# Altium integrated library Supernova Connectors.IntLib: 270 symbols (part 1 of 2)
Pins are listed as number, name and electrical type; pins without a type are passive.

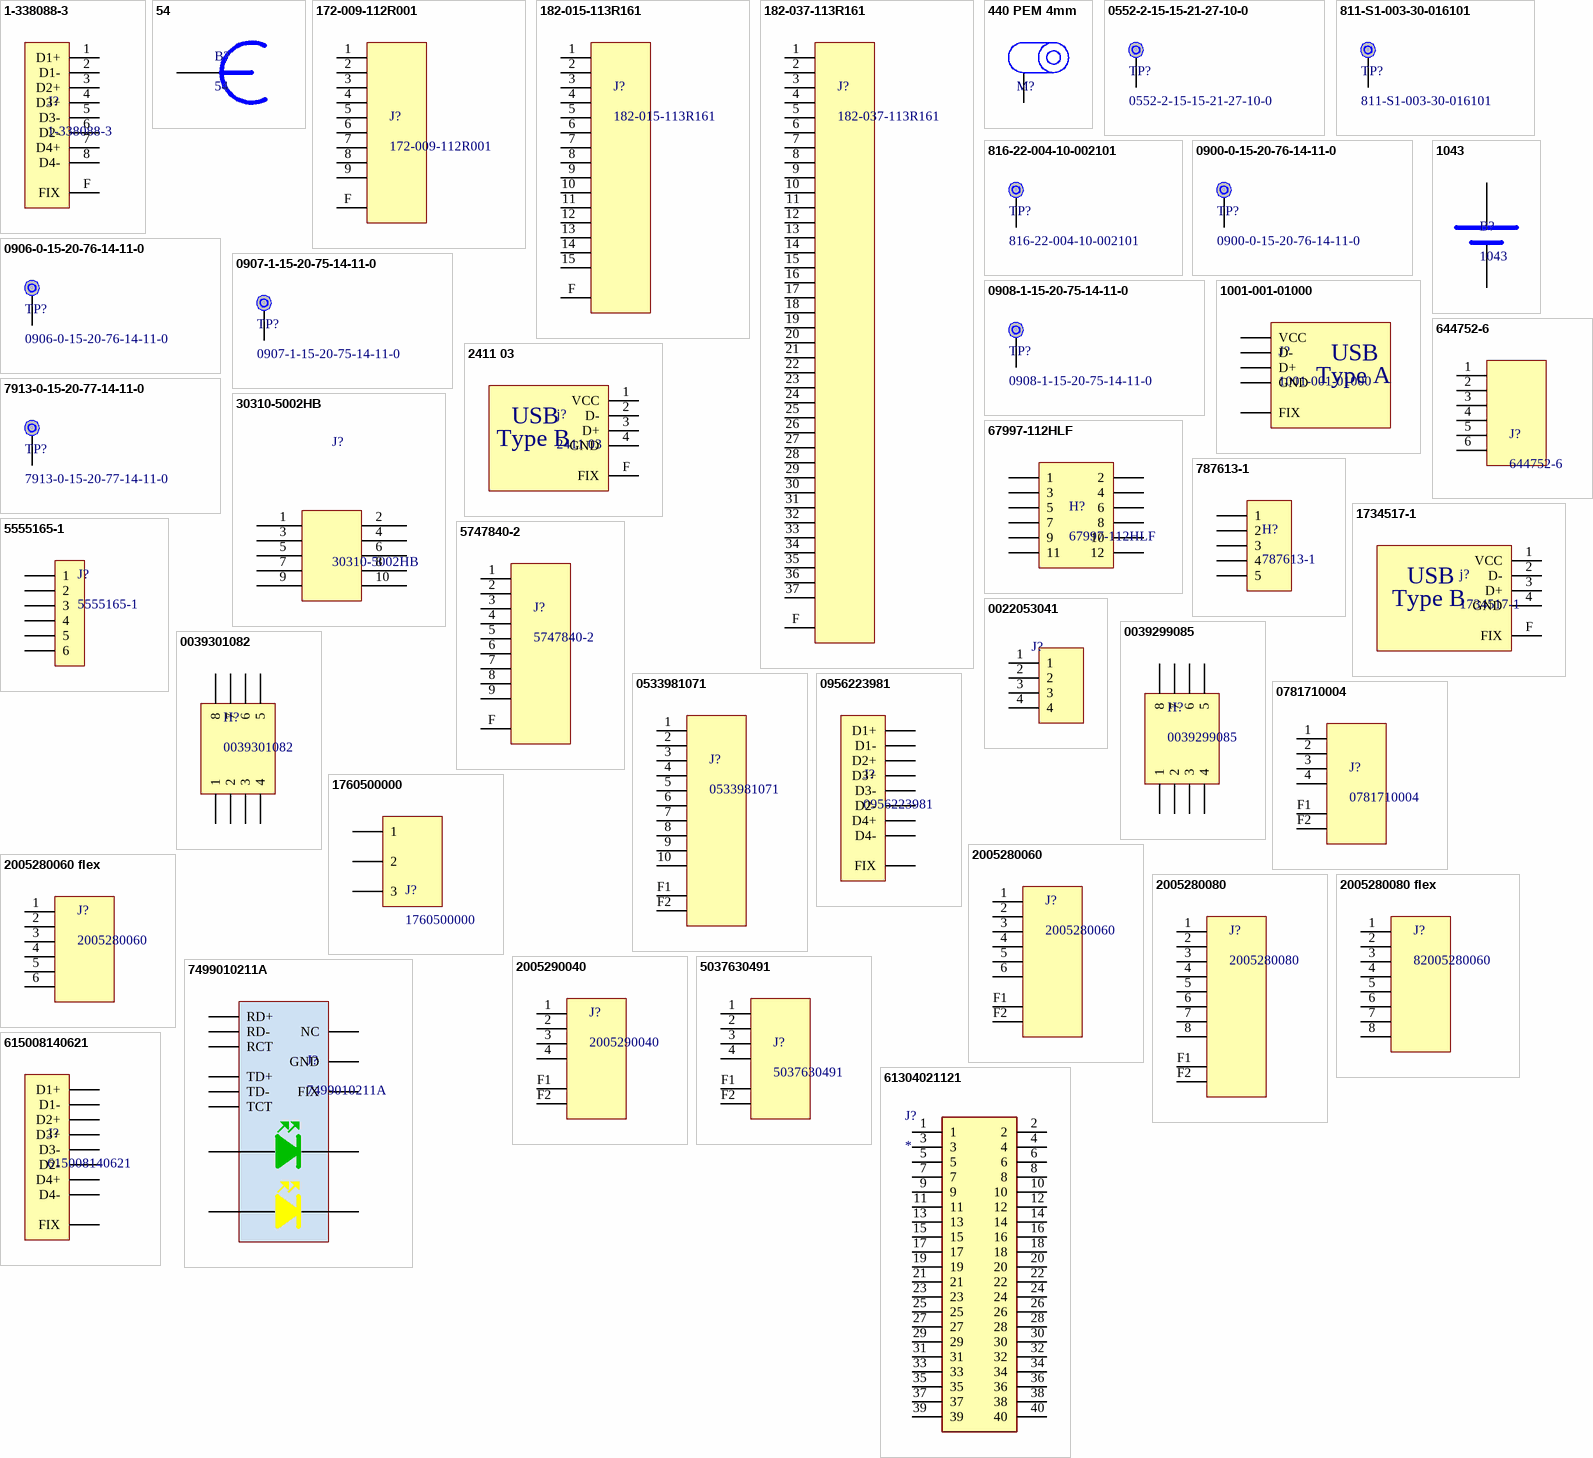
[diagram p0: symbols 1-338088-3 to 615008140621]

## 1-338088-3
designator J?
Header RJ45 No Magnetics Vertical SMD; Supplier 1: Digi-Key; Supplier Part Number 1: A99306CT-ND; Supplier 2: Digi-Key; Supplier Part Number 2: A98534CT-ND
footprint TE 1-338088-3
pins: 1 D1+, 2 D1-, 3 D2+, 4 D3+, 5 D3-, 6 D2-, 7 D4+, 8 D4-, F FIX

## 54
designator B?
Battery 18650 Clip; Supplier 1: Digi-Key; Supplier Part Number 1: 36-54-ND; Supplier 2: Mouser; Supplier Part Number 2: 534-54
footprint 18650 clip
pins: 1

## 172-009-112R001
designator J?
Header DB9 TH; System: Connector; Supplier 1: Digi-Key; Supplier Part Number 1: 1509MNA-ND; Supplier 2: Digi-Key; Supplier 3: Digi-Key; Supplier Part Number 2: AE10973-ND; Supplier Part Number 3: 1509MNEA-ND
footprint 172-009-112Ryy1
pins: 1, 2, 3 1, 4 1, 5 1, 6, 7, 8, 9, F

## 182-015-113R161
designator J?
Header DB15 TH RA; System: Connector; Supplier 1: Digi-Key; Supplier 2: Mouser; Supplier Part Number 1: 182-715ME-ND; Supplier Part Number 2: 636-182-015-113R161
footprint D-Sub-15
pins: 1, 2, 3, 4, 5, 6, 7, 8, 9, 10, 11, 12, 13, 14, 15, F

## 182-037-113R161
designator J?
Header DB37 TH RA; System: Connector; Supplier 1: Digi-Key; Supplier 2: Mouser; Supplier Part Number 1: 182-737ME-ND; Supplier Part Number 2: 636-182-037-113R161
footprint D-Sub-37
pins: 1, 2, 3, 4, 5, 6, 7, 8, 9, 10, 11, 12, 13, 14, 15, 16, 17, 18, 19, 20, 21, 22, 23, 24, 25, 26 13, 27, 28, 29, 30, 31, 32, 33, 34, 35, 36, 37, F

## 440 PEM 4mm
designator M?, comment #4-40 4mm  (value not drawn)
PEM, 440 4mm; System: Connector
footprint 440 PEM
pins: 1

## 0552-2-15-15-21-27-10-0
designator TP?
Testpoint Pin socket; System: Connector; Supplier 1: Digi-Key; Supplier Part Number 1: ED11345-ND; Supplier 2: Mouser; Supplier Part Number 2: 575-552215
footprint 0552-2-15-15-21-27-10-0 (Pin socket)
pins: 1

## 811-S1-003-30-016101
designator TP?
Testpoint Spring SMD x3; System: Connector; Supplier 1: Digi-Key; Supplier 2: Mouser; Supplier Part Number 1: 1212-1522-ND; Supplier Part Number 2: 437-811S100330016101
footprint Spring Testpoint x3 SMD
pins: 1

## 816-22-004-10-002101
designator TP?
Testpoint Spring x3; System: Connector; Supplier 1: Digi-Key; Supplier Part Number 1: ED10676-ND; Supplier 2: Digi-Key; Supplier Part Number 2: 811-S1-003-10-017101-ND
footprint Spring Testpoint x3
pins: 1

## 0900-0-15-20-76-14-11-0
designator TP?
Testpoint Spring SMD short; System: Connector; Supplier 1: Mouser; Supplier 2: Digi-Key; Supplier Part Number 1: 575-0900015207614110; Supplier Part Number 2: ED9000-ND
footprint Spring Testpoint SMD
pins: 1

## 0906-0-15-20-76-14-11-0
designator TP?
Testpoint Spring short; System: Connector; Supplier 1: Mouser; Supplier 2: Digi-Key; Supplier Part Number 1: 575-906015; Supplier Part Number 2: ED8180-ND
footprint Spring Testpoint - short
pins: 1

## 0907-1-15-20-75-14-11-0
designator TP?
Testpoint Spring SMD; System: Connector; Supplier 1: Mouser; Supplier 2: Digi-Key; Supplier Part Number 1: 575-907111; Supplier Part Number 2: ED5064-ND
footprint Spring Testpoint SMD
pins: 1

## 0908-1-15-20-75-14-11-0
designator TP?
Testpoint Spring; System: Connector; Supplier 1: Digi-Key; Supplier 2: Mouser; Supplier Part Number 1: ED90385-ND; Supplier Part Number 2: 575-0908115
footprint Spring Testpoint
pins: 1

## 1001-001-01000
designator J?
Header USB Type A; Supplier 1: Digi-Key; Supplier Part Number 1: 1175-1263-ND; Supplier 2: Digi-Key; Supplier Part Number 2: A31726-ND
footprint USB type A
pins: 1 VCC, 2 D-, 3 D+, 4 GND, F FIX
text: USB; Type A

## 1043
designator B?
Battery 18650 Holder; Supplier 1: Digi-Key; Supplier Part Number 1: 36-1043-ND; Supplier 2: Mouser; Supplier Part Number 2: 534-1043
footprint 1043
footprint 1043 - non-polar
pins: 1, 2

## 2411 03
designator j?
Header USB B TH RA; Supplier 1: Newark; Supplier Part Number 1: 31M6500; Supplier 2: Digi-Key; Supplier Part Number 2: 609-1039-ND
footprint USB-B-RA
pins: 1 VCC, 2 D-, 3 D+, 4 GND, F FIX
text: USB; Type B

## 7913-0-15-20-77-14-11-0
designator TP?
Testpoint Spring TH; System: Connector; Supplier 1: Digi-Key; Supplier Part Number 1: ED10398-ND; Supplier 2: Mouser; Supplier Part Number 2: 575-7913015207714110
footprint 7913-0-15-20-77-14-11-0 (Pin socket)
pins: 1

## 30310-5002HB
designator J?
Header 10 pin Box RA; System: Connector; Supplier 1: Digi-Key; Supplier 2: Digi-Key; Supplier Part Number 1: 3M15452-ND; Supplier Part Number 2: A33179-ND
footprint 2x5 Shrouded Box RA (2x5 Shrouded Box)
pins: 1, 2, 3, 4, 5, 6, 7, 8, 9, 10

## 67997-112HLF
designator H?
Header 6x2 TH; System: Connector; Supplier 1: Digi-Key; Supplier Part Number 1: 609-3227-ND; Supplier 2: Digi-Key; Supplier Part Number 2: SAM10851-ND
footprint 6x2 0.100" header
pins: 1, 2, 3, 4, 5, 6, 7, 8, 9, 10, 11, 12

## 644752-6
designator J?
Header MTA 6 pin; System: Connector; Supplier 1: Digi-Key; Supplier Part Number 1: A24168-ND; Supplier 2: Mouser; Supplier Part Number 2: 571-6447526
footprint 644752-6
pins: 1, 2, 3 1, 4 1, 5 1, 6

## 787613-1
designator H?
Header 5 Pin Blade Female; Supplier 1: Digi-Key; Supplier 2: Mouser; Supplier Part Number 1: 787613-1-ND; Supplier Part Number 2: 571-787613-1
footprint 787613-1
pins: 1, 2, 3, 4, 5

## 1734517-1
designator j?
Header USB B SMD; Supplier 1: Digi-Key; Supplier Part Number 1: A111053CT-ND; Supplier 2: Mouser; Supplier Part Number 2: 571-1734517-1
footprint TE 1734517-1
pins: 1 VCC, 2 D-, 3 D+, 4 GND, F FIX
text: USB; Type B

## 5555165-1
designator J?
Header RJ11 Right angle; Supplier 1: Digi-Key; Supplier Part Number 1: A31422-ND; Supplier 2: Digi-Key; Supplier Part Number 2: AE10383-ND
footprint 5555165-1
pins: 1, 2, 3, 4, 5, 6

## 5747840-2
designator J?
Header DB9 TH RA; Supplier 1: Digi-Key; Supplier Part Number 1: A32090-ND; Supplier 2: Mouser; Supplier Part Number 2: 571-5747840-2; System: *
footprint 5747840-2
pins: 1, 2, 3 1, 4 1, 5 1, 6, 7, 8, 9, F

## 0022053041
designator J?  (value not drawn)
Header 4POS .100 R/A TIN; System: Connector; Supplier 1: Digi-Key; Supplier 2: Digi-Key; Supplier Part Number 1: WM4302-ND; Supplier Part Number 2: WM10159-ND
footprint 4POS SMBUS Molex Inc. (CONN HEADER 4POS .100 R/A TIN 0022053041)
pins: 1, 2, 3, 4

## 0039299085
designator H?
Header 4x2 TH 4.2mm pitch; System: Connector; Supplier 1: Digi-Key; Supplier 2: Digi-Key; Supplier Part Number 1: WM2844-ND; Supplier Part Number 2: 23-0039299084-ND
footprint 0039299085
pins: 1, 2, 3, 4, 5, 6, 7, 8

## 0039301082
designator H?
Header 4x2 TH RA 4.2mm pitch; System: Connector; Supplier 1: Digi-Key; Supplier 2: Digi-Key; Supplier Part Number 1: WM21366-ND; Supplier Part Number 2: WM1366-ND
footprint 0039301082
pins: 1, 2, 3, 4, 5, 6, 7, 8

## 0533981071
designator J?
Header PicoBlade 10-Pin; System: Connector; Supplier 1: Digi-Key; Supplier 2: Mouser; Supplier Part Number 1: WM7614CT-ND; Supplier Part Number 2: 538-53398-1071
footprint 0533981071
pins: 1, 2, 3, 4, 5, 6, 7, 8, 9, 10, F1, F2

## 0781710004
designator J?
Header Pico-EZMate 4 pin; System: Connector; Supplier 1: Digi-Key; Supplier 2: Mouser; Supplier Part Number 2: 538-78171-0004; Supplier Part Number 1: WM4460CT-ND
footprint 0781710004
pins: 1, 2, 3 1, 4 1, F1 1, F2 1

## 0956223981
designator J?
Header RJ45 No Magnetics RA TH Tab=Down; Supplier 1: Digi-Key; Supplier Part Number 1: WM3653-ND; Supplier 2: Digi-Key; Supplier Part Number 2: AE10387-ND
footprint 956223981
pins: 1 D1+, 2 D1-, 3 D2+, 4 D3+, 5 D3-, 6 D2-, 7 D4+, 8 D4-, F FIX

## 1760500000
designator J?
Header Screw terminal 3 pins; Supplier 1: Digi-Key; Supplier 2: Digi-Key; Supplier Part Number 1: 281-2882-ND; Supplier Part Number 2: ED1976-ND
footprint ED500/3DS
pins: 1, 2, 3

## 2005280060
designator J?
Header Flex Connector 6 pin; top side; notched; System: Connector; Supplier 1: Digi-Key; Supplier Part Number 1: WM24188CT-ND; Supplier 2: Mouser; Supplier Part Number 2: 538-200528-0060
footprint 2005280060
pins: 1, 2 1, 3 1, 4 1, 5 2, 6 3, F1, F2

## 2005280060 flex
designator J?, comment 2005280060  (no BOM)
Flex Connector 4 pin; top side; notched; System: Connector
footprint 2005280060 mating flex
pins: 1, 2 1, 3 1, 4 1, 5 2, 6 3

## 2005280080
designator J?
Header Flex Connector 8 pin; top side; notched; System: Connector; Supplier 1: Mouser; Supplier Part Number 1: 538-200528-0080; Supplier 2: Digi-Key; Supplier Part Number 2: WM17815CT-ND
footprint 2005280080
pins: 1, 2 1, 3 1, 4 1, 5 2, 6 3, 7 2, 8 3, F1, F2

## 2005280080 flex
designator J?, comment 82005280060  (no BOM)
Flex Connector 8 pin; notched; System: Connector
footprint 2005280080 mating flex - SM Defined
footprint 2005280080 mating flex
pins: 1, 2 1, 3 1, 4 1, 5 2, 6 3, 7 2, 8 3

## 2005290040
designator J?
Header Flex Connector 4 pin; top side; notched; Supplier 1: Digi-Key; Supplier 2: Mouser; Supplier Part Number 1: WM24189CT-ND; Supplier Part Number 2: 538-200529-0040; System: Connector
footprint 2005290040
pins: 1, 2 1, 3 1, 4 1, F1, F2

## 5037630491
designator J?
Header Pico-Lock 4 pin; System: Connector; Supplier 1: Digi-Key; Supplier 2: Mouser; Supplier Part Number 1: WM10655CT-ND; Supplier Part Number 2: 538-503763-0491
footprint 5037630491
pins: 1, 2, 3 1, 4 1, F1, F2

## 7499010211A
designator J?
Header RJ45 with Magnetics RA TH Tab=Down; Supplier 1: Digi-Key; Supplier 2: Digi-Key; Supplier Part Number 1: 732-4506-5-ND; Supplier Part Number 2: 553-1619-5-ND
footprint 7499010211A
pins: 1 TD+, 2 TD-, 3 RD+, 4 TCT, 5 RCT, 6 RD-, 7 NC, 8 GND, 9, 10, 11, 12, F FIX

## 61304021121
designator J?
Connector; Manufacturer_Name: Wurth Elektronik; Manufacturer_Part_Number: 61304021121; Datasheet Link: https://katalog.we-online.com/em/datasheet/6130xx21121.pdf; Height: 8.69mm; Mouser Part Number: 710-61304021121; Mouser Price/Stock: https://www.mouser.co.uk/ProductDetail/Wurth-Elektronik/61304021121?qs=PhR8RmCirEYWKI5WqdDUyg%3D%3D
footprint HDRV40W64P254X254_2X20_5080X508X869P
pins: 1, 2, 3, 4, 5, 6, 7, 8, 9, 10, 11, 12, 13, 14, 15, 16, 17, 18, 19, 20, 21, 22, 23, 24, 25, 26, 27, 28, 29, 30, 31, 32, 33, 34, 35, 36, 37, 38, 39, 40

## 615008140621
designator J?
Header RJ45 No Magnetics RA TH Tab=Up; Supplier 1: Digi-Key; Supplier Part Number 1: 732-2742-ND; Supplier 2: Digi-Key; Supplier Part Number 2: RJHSE-5480-ND
footprint RJ45 No Mag
pins: 1 D1+, 2 D1-, 3 D2+, 4 D3+, 5 D3-, 6 D2-, 7 D4+, 8 D4-, F FIX

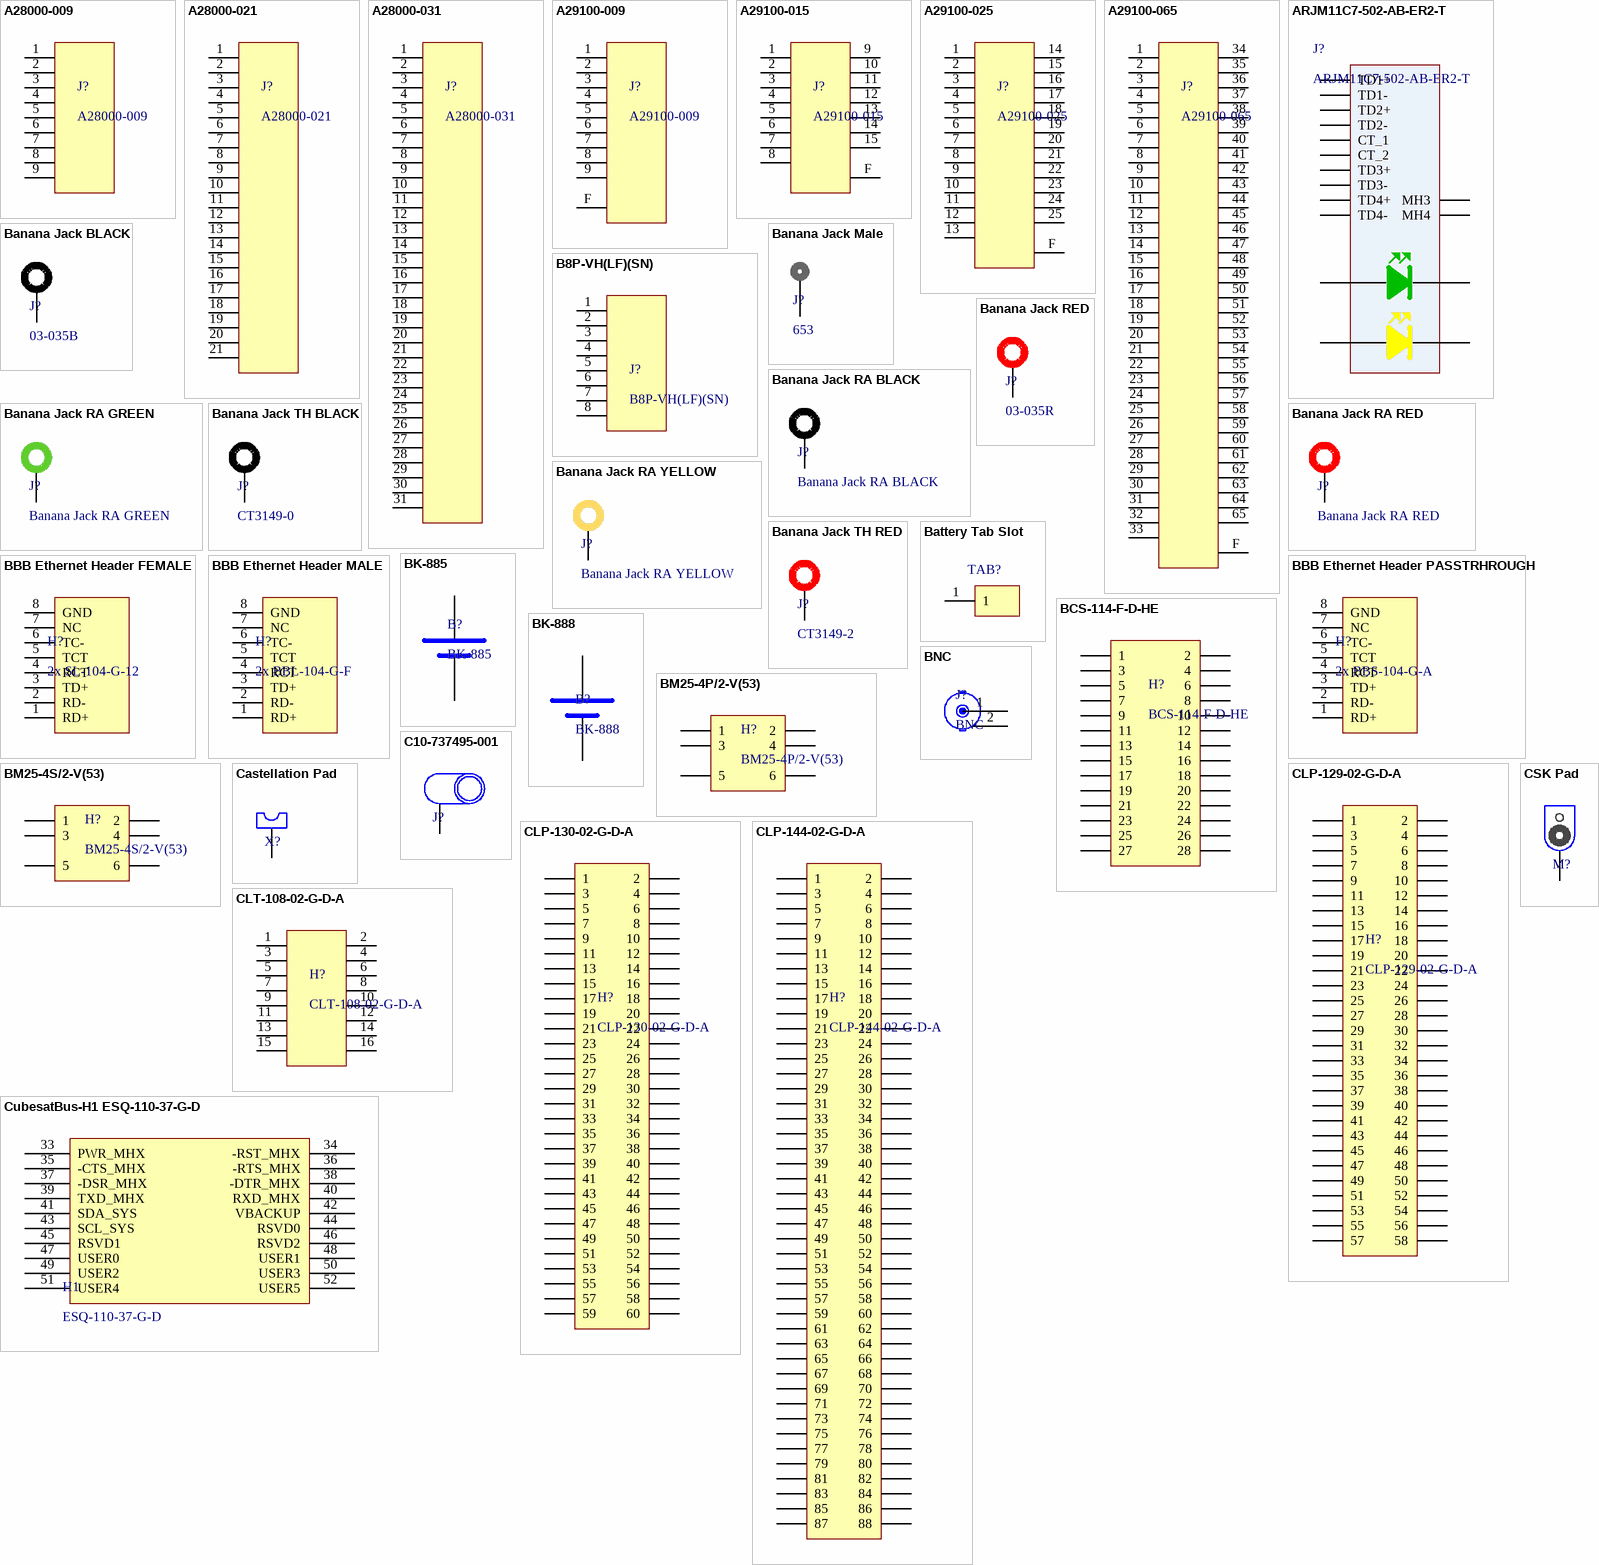
[diagram p1: symbols A28000-009 to CubesatBus-H1 ESQ-110-37-G-D]

## A28000-009
designator J?
Connector Omnetics Bi-Lobe 9 pins
pins: 1, 2, 3 1, 4 1, 5 1, 6 1, 7 1, 8 1, 9 1

## A28000-021
designator J?
Connector Omnetics Bi-Lobe 21 pins
pins: 1, 2, 3 1, 4 1, 5 1, 6 1, 7 1, 8 1, 9 1, 10 1, 11 1, 12 1, 13 1, 14 1, 15 2, 16 3, 17 4, 18 5, 19 6, 20 7, 21 8

## A28000-031
designator J?
Connector Omnetics Bi-Lobe 31 pins
pins: 1, 2, 3 1, 4 1, 5 1, 6 1, 7 1, 8 1, 9 1, 10 1, 11 1, 12 1, 13 1, 14 1, 15 2, 16 3, 17 4, 18 5, 19 6, 20 7, 21 8, 22 9, 23 10, 24 11, 25 12, 26 13, 27 14, 28 15, 29 16, 30 17, 31 18

## A29100-009
designator J?
Header Omnetics A29100-009; System: Connector; Manufacturer 1: Omnetics; Manufacturer Part Number 1: A29100-009; Supplier 1: Omnetics; Supplier Part Number 1: A29100-009; Supplier Pricing 1: 110.00
footprint A29100-009
pins: 1, 2, 3 1, 4 1, 5 1, 6, 7, 8, 9, F

## A29100-015
designator J?
Header Omnetics A29100-015; System: Connector; Manufacturer 1: Omnetics; Manufacturer Part Number 1: A29100-015; Supplier 1: Omnetics; Supplier Part Number 1: A29100-015; Supplier Pricing 1: 110.00
footprint A29100-015
pins: 1, 2, 3 1, 4 1, 5 1, 6, 7, 8, 9, 10, 11, 12, 13, 14, 15, F

## A29100-025
designator J?
Header Omnetics A29100-025; System: Connector; Manufacturer 1: Omnetics; Manufacturer Part Number 1: A29100-025; Supplier 1: Omnetics; Supplier Part Number 1: A29100-025; Supplier Pricing 1: 110.00
footprint A29100-025
pins: 1, 2, 3 1, 4 1, 5 1, 6, 7, 8, 9, 10, 11, 12, 13, 14, 15, 16, 17, 18, 19, 20, 21, 22, 23, 24, 25, F

## A29100-065
designator J?
Header Omnetics A29100-065; System: Connector; Manufacturer 1: Omnetics; Manufacturer Part Number 1: A29100-065; Supplier 1: Omnetics; Supplier Part Number 1: A29100-065; Supplier Pricing 1: 110.00
footprint A29100-065
pins: 1, 2, 3 1, 4 1, 5 1, 6, 7, 8, 9, 10, 11, 12, 13, 14, 15, 16, 17, 18, 19, 20, 21, 22, 23, 24, 25, 26, 27, 28, 29, 30, 31, 32, 33, 34, 35, 36, 37, 38, 39, 40, 41, 42, 43, 44, 45, 46, 47, 48, 49, 50, 51, 52, 53, 54, 55, 56, 57, 58, 59, 60, 61, 62, 63, 64, 65, F

## ARJM11C7-502-AB-ER2-T
designator J?
RJ45 JACK W/MAG 1X1 1000BASE-T; Manufacturer_Name: ABRACON; Datasheet Link: https://abracon.com/Magnetics/ARJM11.pdf; Height: 13.7mm; Manufacturer_Part_Number: ARJM11C7-502-AB-ER2-T; Mouser Part Number: 815-RJM11C7502ABER2T; Mouser Price/Stock: https://www.mouser.co.uk/ProductDetail/ABRACON/ARJM11C7-502-AB-ER2-T?qs=YCa%2FAAYMW01Li4L1TO4qtw%3D%3D; Arrow Part Number: ARJM11C7-502-AB-ER2-T; Arrow Price/Stock: https://www.arrow.com/en/products/arjm11c7-502-ab-er2-t/abracon?region=nac; Supplier 1: Digi-Key; Supplier 2: Mouser; Supplier Part Number 1: 535-14130-6-ND; Supplier Part Number 2: 815-RJM11C7502ABER2T
footprint ARJM11C7502ABER2T
pins: MH3, MH4, P1 TD1+, P2 TD1-, P3 TD2+, P4 TD2-, P5 CT_1, P6 CT_2, P7 TD3+, P8 TD3-, P9 TD4+, P10 TD4-, P11, P12, P13, P14

## B8P-VH(LF)(SN)
designator J?
Header VH 8 pin; System: Connector; Supplier 1: Digi-Key; Supplier Part Number 1: 455-1645-ND
footprint B8P-VH(LF)(SN)
pins: 1, 2, 3 1, 4 1, 5 1, 6, 7, 8

## Banana Jack BLACK
designator J?, comment 03-035B
Banana Jack Vertical BLACK; Manufacturer 1: Jameco Benchpro; Supplier 1: Jameco; Supplier Part Number 1: 2244439; Manufacturer Part Number 1: 03-035B; Supplier Pricing 1: 1.19
footprint Banana Jack BLACK
pins: 1

## Banana Jack Male
designator J?, comment 653
Banana Jack MALE; Supplier 1: Digi-Key; Supplier 2: Mouser; Supplier Part Number 1: 36-653-ND; Supplier Part Number 2: 534-653
footprint Banana Jack MALE
pins: 1

## Banana Jack RA BLACK
designator J?
Supplier 1: Digi-Key; Supplier Part Number 1: BKCT3151SP-0-ND; Supplier 2: Mouser; Supplier Part Number 2: 510-CT3151SP-0
footprint BANANA RA BLACK
pins: 1

## Banana Jack RA GREEN
designator J?
Supplier 1: Digi-Key; Supplier Part Number 1: BKCT3151SP-5-ND
footprint BANANA RA GREEN
pins: 1

## Banana Jack RA RED
designator J?
Supplier 1: Digi-Key; Supplier Part Number 1: BKCT3151SP-2-ND; Supplier 2: Mouser; Supplier Part Number 2: 510-CT3151SP-2
footprint BANANA RA RED
pins: 1

## Banana Jack RA YELLOW
designator J?
Supplier 1: Digi-Key; Supplier Part Number 1: BKCT3151SP-4-ND
footprint BANANA RA YELLOW
pins: 1

## Banana Jack RED
designator J?, comment 03-035R
Banana Jack Vertical RED; Manufacturer 1: Jameco Benchpro; Supplier 1: Jameco; Supplier Part Number 1: 2244447; Manufacturer Part Number 1: 03-035R; Supplier Pricing 1: 1.19
footprint Banana Jack RED
pins: 1

## Banana Jack TH BLACK
designator J?, comment CT3149-0
Banana Jack Vertical TH BLACK; Supplier 1: Digi-Key; Supplier Part Number 1: BKCT3149-0-ND; Supplier 2: Mouser; Supplier Part Number 2: 510-CT3149-0
footprint Banana Jack TH BLACK
pins: 1

## Banana Jack TH RED
designator J?, comment CT3149-2
Banana Jack Vertical TH RED; Supplier 1: Digi-Key; Supplier Part Number 1: BKCT3149-2-ND; Supplier 2: Mouser; Supplier Part Number 2: 510-CT3149-2
footprint Banana Jack TH RED
pins: 1

## Battery Tab Slot
designator TAB?, comment Battery Tab Pad  (value not drawn)  (no BOM)
Battery tab slot
footprint Battery Tab Pad (Slot - 1mm x 6mm)
footprint Battery Tab Slot (Slot - 1.5mm x 7.25mm)
footprint Battery Tab Pad with slot (Slot - 1mm x 6mm)
pins: 1

## BBB Ethernet Header FEMALE
designator H?, comment 2x SL-104-G-12
Header for BBB Ethernet; System: Connector; Quantity: 2; Supplier 1: Digi-Key; Supplier 2: Newark; Supplier Part Number 1: SAM1104-08-ND; Supplier Part Number 2: 11P6617
footprint Ethernet Header FEMALE
pins: 1 RD+, 2 RD-, 3 TD+, 4 RCT, 5 TCT, 6 TC-, 7 NC, 8 GND

## BBB Ethernet Header MALE
designator H?, comment 2x BBL-104-G-F
Header for BBB Ethernet; System: Connector; Supplier 1: Newark; Supplier 2: Digi-Key; Supplier Part Number 1: 11P3037; Supplier Part Number 2: SAM1001-08-ND
footprint Ethernet Header MALE
pins: 1 RD+, 2 RD-, 3 TD+, 4 RCT, 5 TCT, 6 TC-, 7 NC, 8 GND

## BBB Ethernet Header PASSTRHROUGH
designator H?, comment 2x BBS-104-G-A
Header for BBB Ethernet; System: Connector; Supplier 1: Digi-Key; Supplier 2: Newark; Supplier Part Number 1: SAM1004-08-ND; Supplier Part Number 2: 11P3149
footprint Ethernet Header PASSTHROUGH
pins: 1 RD+, 2 RD-, 3 TD+, 4 RCT, 5 TCT, 6 TC-, 7 NC, 8 GND

## BCS-114-F-D-HE
designator H?
Header 14x2 TH RA; System: Connector; Supplier 1: Digi-Key; Supplier Part Number 1: BCS-114-F-D-HE-ND; Supplier 2: Digi-Key; Supplier 3: Newark; Supplier 4: Digi-Key; Supplier Part Number 2: BCS-114-LM-D-HE-ND; Supplier Part Number 3: 87P2270; Supplier Part Number 4: BCS-114-S-D-HE-ND
footprint BCS-114-F-D-HE
pins: 1, 2, 3, 4, 5, 6, 7, 8, 9, 10, 11, 12, 13, 14, 15, 16, 17, 18, 19, 20, 21, 22, 23, 24, 25, 26, 27, 28

## BK-885
designator B?
Battery 1216 Holder; Supplier 1: Digi-Key; Supplier Part Number 1: BK-885-ND; Supplier 2: Digi-Key; Supplier 3: Digi-Key; Supplier Part Number 2: BK-885-CT-ND; Supplier Part Number 3: 36-3000CT-ND
footprint 1216 Battery Holder
pins: 1, 2

## BK-888
designator B?
Battery 20xx Holder; Supplier 1: Digi-Key; Supplier 2: Digi-Key; Supplier Part Number 1: BK-888-ND; Supplier Part Number 2: 36-3003-ND
footprint BK-888
pins: 1, 2

## BM25-4P/2-V(53)
designator H?
Header 6 pin micro; 2 power; 4 signal; System: Connector; Supplier 1: Digi-Key; Supplier 2: Mouser; Supplier Part Number 2: 798-BM25-4P/2-V53; Supplier Part Number 1: H124948CT-ND
footprint BM25-4P/2-V(53)
pins: 1, 2, 3, 4, 5, 6

## BM25-4S/2-V(53)
designator H?
Header 6 pin micro; 2 power; 4 signal; System: Connector; Supplier 1: Digi-Key; Supplier 2: Mouser; Supplier Part Number 1: H124947CT-ND; Supplier Part Number 2: 798-BM25-4S/2-V53
footprint BM25-4S/2-V(53)
pins: 1, 2, 3, 4, 5, 6
